# Altium footprint library 布洛电子PCB封装库-电阻电容电感.PcbLib: 59 footprints (part 4 of 4)
Each footprint in its own frame and in the unit in brackets; x right, y up, seen from the top. Pads: shape width x height; smd on the part's side, far side on the other; paste and mask are expansions set on the pad; w line width, h text height; cw(c..) or ccw(c..) is an arc to the next point about the centre after c.
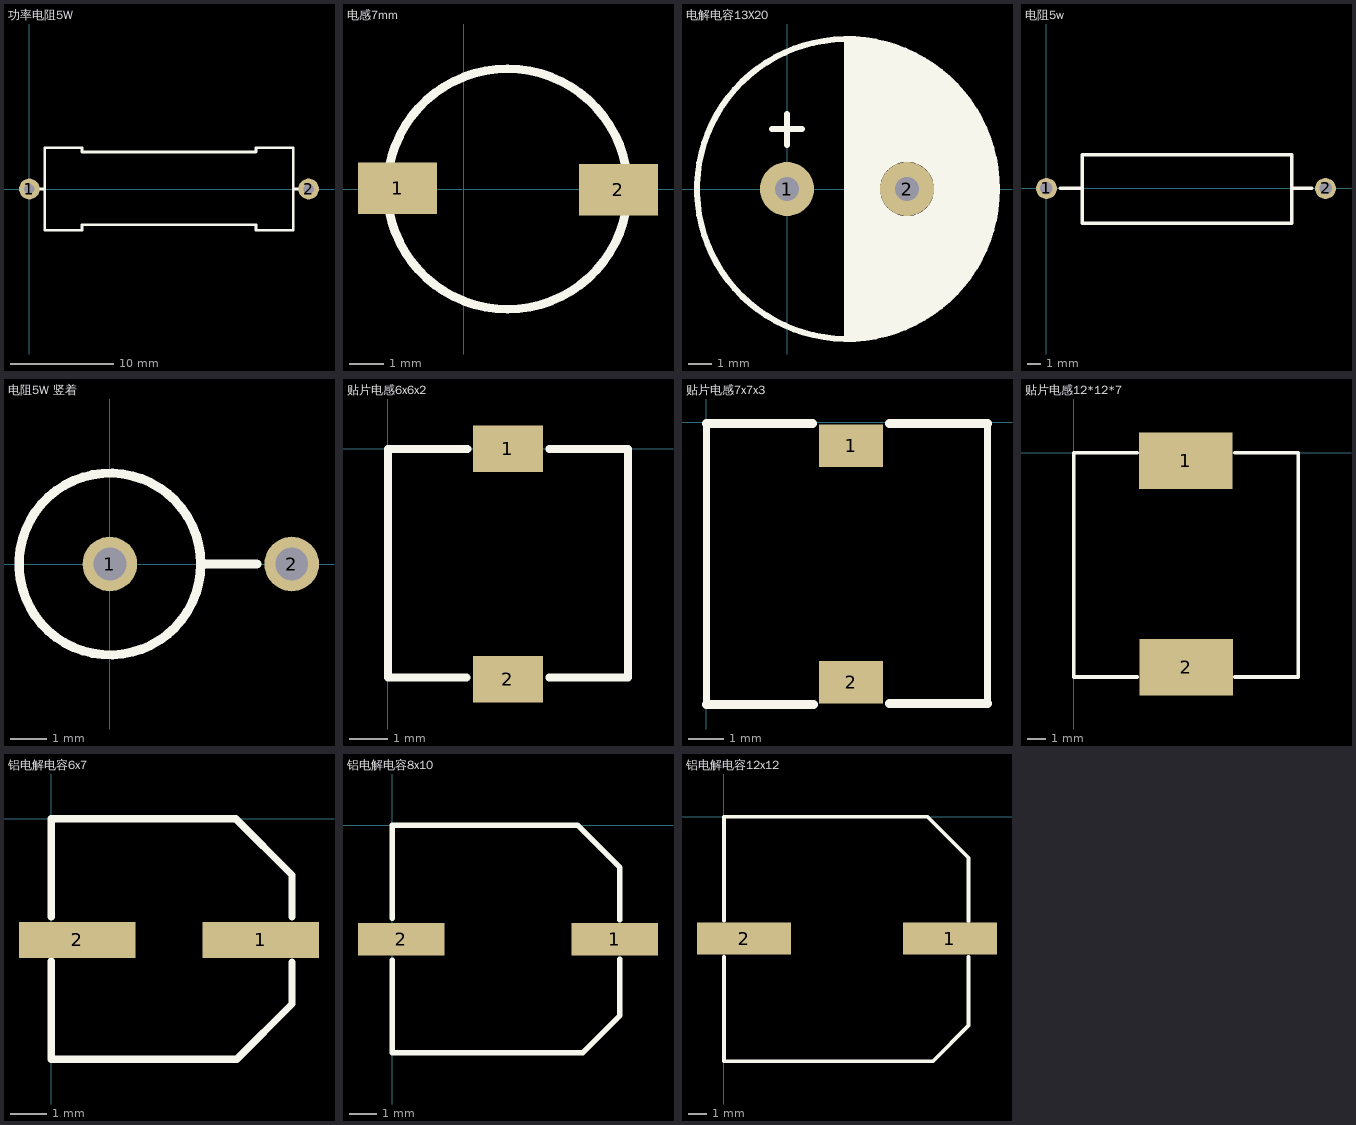
[diagram p3: the footprints below, top view; thin cyan lines are the x and y axes]

## 功率电阻5W [mm]
pads (2):
  round 2 hole 1: 1(0,0) 2(27,0)
Top Overlay:
  lines w0.254: 0,0 1.5,0 ; 27,0 25.5,0 ; 1.5,0 1.5,4 5.093,4 5.093,3.581 21.907,3.581 21.907,4 25.5,4 25.5,0 ; 1.5,0 1.5,-4 5.093,-4 5.093,-3.454 21.907,-3.454 21.907,-4 25.5,-4 25.5,0
3D body: height 7.75, standoff -4.36, extent 0.164,-3.683 26.964,3.817

## 电感7mm [mm]
pads (2):
  rect 2.3x1.5 smd: 1(-1.93,0.025) 2(4.496,-0.025)
Top Overlay:
  circle w0.254: c1.27,0 r3.5

## 电解电容13X20 [mil]
pads (2):
  round 90 hole 40: 1(0,0) 2(200,0)
Top Overlay:
  circle w10: c100,0 r250
  circle w10: c200,0 r50
  circle w50: c200,0 r76.16
  lines w10: -25.2,100 25.2,100 ; 0,73.62 0,125.2 ; 100,-250 100,245 ; 110,-245 100,-235 100,75 110,85 110,235 100,245 ; 120,245 100,245
  lines w50: 120,-50 ccw(c225,-10) 265,-115 ; 120,130 cw(c152.5,67.5) 215,100 ; 120,165 cw(c147.5,62.5) 250,90 ; 120,195 cw(c125,30) 290,35 ; 120,220 cw(c110,10) 320,0 cw(c110,-15) 125,-225 cw(c132.5,-217.5) 125,-210 ; 125,-165 ccw(c147.5,-177.5) 135,-200 ; 125,-120 ccw(c185,-125) 180,-185 ; 125,-90 ccw(c215,-70) 235,-160 ; 125,50 cw(c150,55) 145,80 ; 125,95 cw(c157.5,62.5) 190,95 ; 135,-30 ccw(c225,20) 275,-70 ; 285,-80 ccw(c270,-55) 295,-40
3D body: height 818.9, standoff -27.56, extent -155,-256 356.63,255.05

## 电阻5w [mm]
pads (2):
  round 1.5 hole 0.9: 1(0,0) 2(20,0)
Top Overlay:
  lines w0.254: 0.991,0 2.565,0 ; 17.577,0 19.025,0 ; 2.565,-2.489 17.577,-2.489 17.577,2.413 2.565,2.413 2.565,-2.489

## 电阻5W 竖着 [mm]
pads (2):
  round 1.5 hole 0.9: 1(0,0) 2(5,0)
Top Overlay:
  circle w0.254: c0,0 r2.5
  lines w0.254: 2.5,0 4.039,0

## 贴片电感6x6x2 [mm]
pads (2):
  rect 1.8x1.2 smd: 1(3.099,0) 2(3.099,-5.944)
Top Overlay:
  lines w0.203: 2.032,-5.9 0,-5.9 0,0 2.057,0 ; 4.166,-5.9 6.2,-5.9 6.2,0 4.166,0

## 贴片电感7x7x3 [mm]
pads (2):
  rect 1.8x1.2 smd: 1(4.089,-0.66) 2(4.089,-7.341)
Top Overlay:
  lines w0.203: 0,-7.976 0,-0.025 ; 7.95,-7.95 7.95,-0.025
  lines w0.254: 0,-7.976 3.023,-7.976 ; 0,-0.025 2.997,-0.025 ; 5.182,-7.95 7.95,-7.95 ; 5.182,-0.025 7.95,-0.025
3D body: height 3, standoff -0.1, extent -0.05,-8.064 7.95,-0.064

## 贴片电感12*12*7 [mm]
pads (2):
  rect 5x3 smd: 1(5.994,-0.432) 2(6.02,-11.481)
Top Overlay:
  lines w0.203: 3.381,-12 0,-12 0,0 3.381,0 ; 8.619,-12 12,-12 12,0 8.619,0
3D body: height 8.05, standoff -0.04, extent -0.156,-12.167 12.144,0.133

## 铝电解电容6x7 [mm]
pads (2):
  rect 3.2x1 smd: 1(5.74,-3.327) 2(0.711,-3.327)
Top Overlay:
  lines w0.203: 0,-3.912 0,-6.6 5.084,-6.6 6.6,-5.084 6.6,-3.937 ; 0,-2.692 0,0 5.055,0 6.6,-1.545 6.6,-2.692
3D body: height 7.7, standoff 0, extent -0.142,-6.6 6.858,0

## 铝电解电容8x10 [mm]
pads (2):
  rect 3.2x1.2 smd: 1(8.204,-4.216) 2(0.33,-4.216)
Top Overlay:
  lines w0.203: 0,-4.978 0,-8.4 7.018,-8.4 8.4,-7.018 8.4,-4.946 ; 0,-3.429 0,0 6.833,0 8.4,-1.567 8.4,-3.498
3D body: height 10.2, standoff 0, extent -0.737,-8.382 9.163,-0.082

## 铝电解电容12x12 [mm]
pads (2):
  rect 5x1.7 smd: 1(12.014,-6.477) 2(1.067,-6.477)
Top Overlay:
  lines w0.203: 0,-7.442 0,-9.75 0,-13 11.105,-13 13,-11.105 13,-8.873 13,-7.447 ; 0,-5.512 0,-3.25 0,0 10.82,0 13,-2.18 13,-4.411 13,-5.558
3D body: height 14.05, standoff 0.05, extent -0.878,-13.395 14.122,0.305